# Altium footprint library Footprints.PcbLib: 118 footprints (part 5 of 8)
Each footprint in its own frame and in the unit in brackets; x right, y up, seen from the top. Pads: shape width x height; smd on the part's side, far side on the other; paste and mask are expansions set on the pad; w line width, h text height; cw(c..) or ccw(c..) is an arc to the next point about the centre after c.
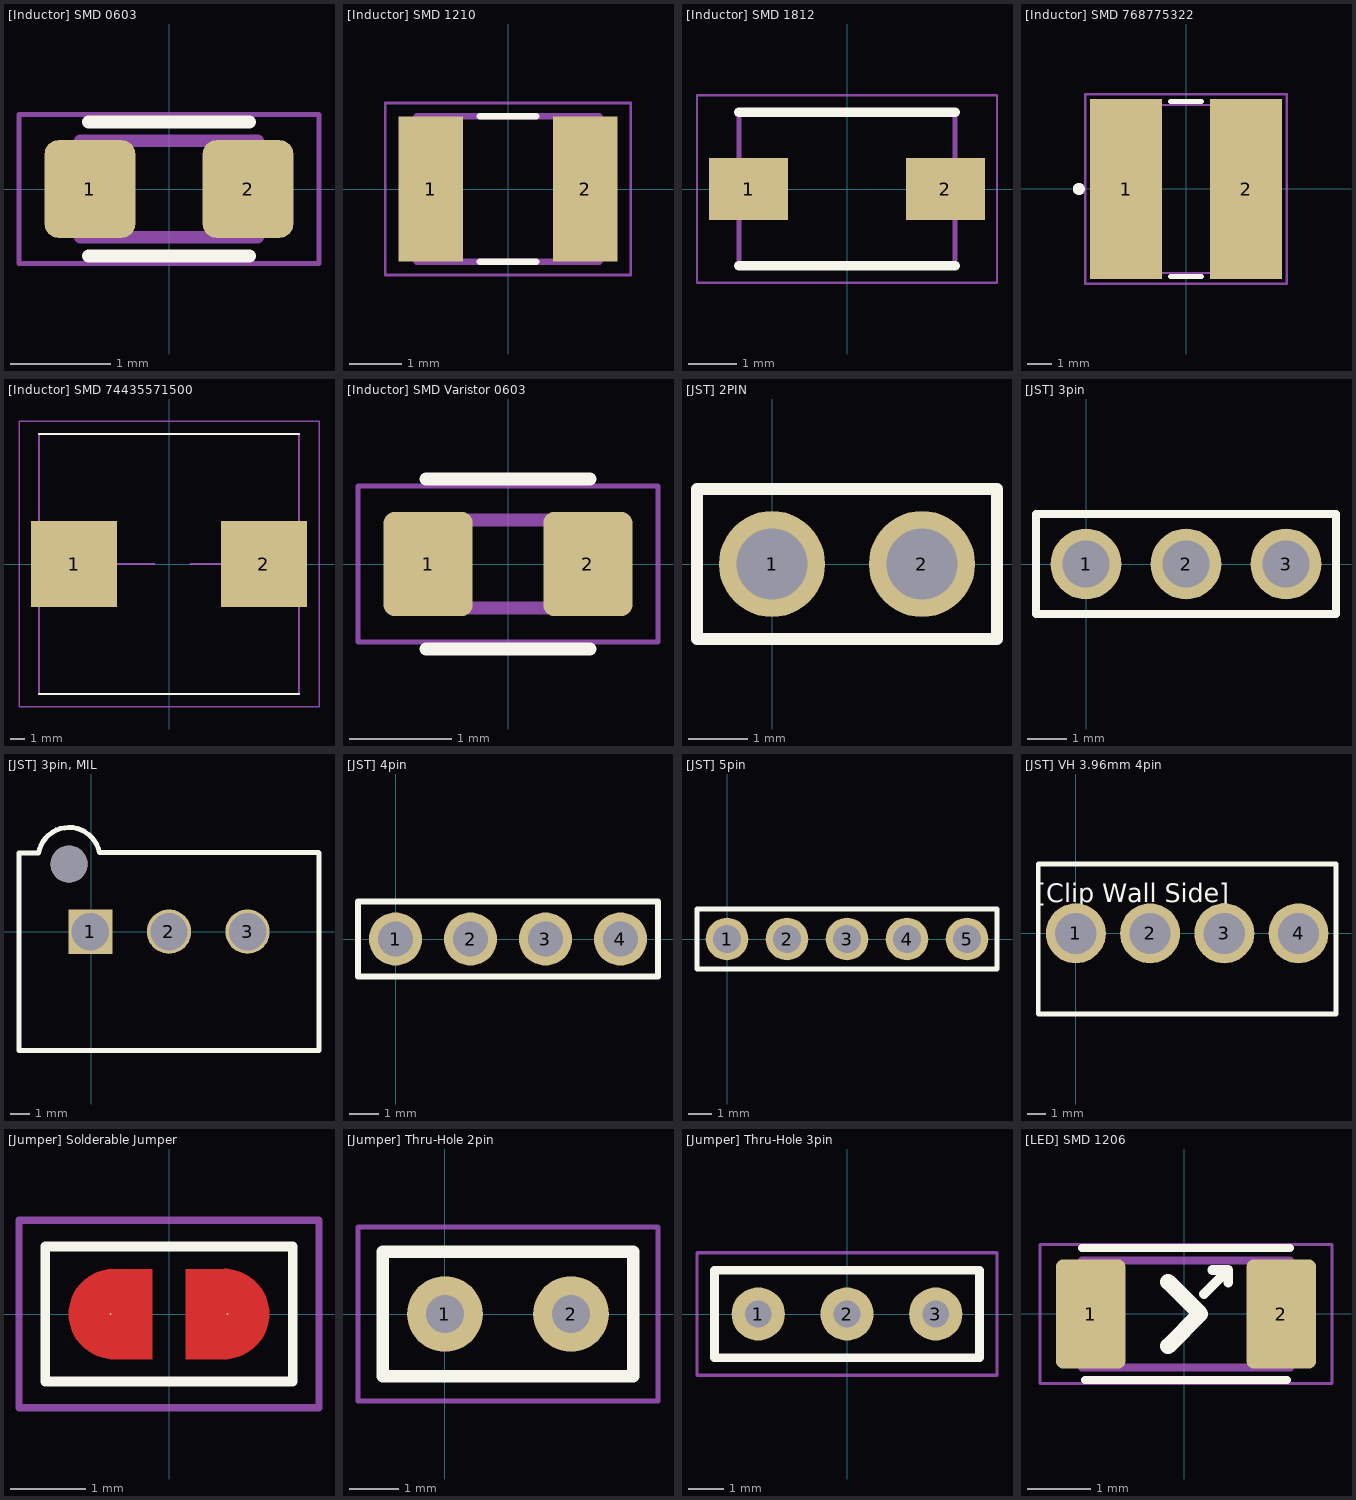
[diagram p4: the footprints below, top view; thin cyan lines are the x and y axes]

## [Inductor] SMD 0603 [mm]
pads (2):
  rrect30% 0.9x0.97 smd: 1(-0.785,0) 2(0.785,0)
Top Overlay:
  lines w0.127: -0.8,-0.665 0.8,-0.665 ; -0.8,0.665 0.8,0.665
Physical Outline:
  lines w0.127: -0.88,-0.48 0.88,-0.48 0.88,0.48 -0.88,0.48 -0.88,-0.48
Part Border:
  lines w0.05: -1.49,-0.74 -1.49,0.74 1.49,0.74 1.49,-0.74 -1.49,-0.74
3D body "SMD Inductor [0603].STEP": height 0.95, standoff 0, extent -0.8,-0.4 0.8,0.4

## [Inductor] SMD 1210 [mm]
pads (2):
  rect 1.23x2.76 smd: 1(-1.466,0) 2(1.466,0)
Top Overlay:
  lines w0.127: -0.53,-1.38 0.53,-1.38 ; -0.53,1.38 0.53,1.38
Physical Outline:
  lines w0.127: -1.73,-1.38 1.73,-1.38 1.73,1.38 -1.73,1.38 -1.73,-1.38
Part Border:
  lines w0.05: -2.331,-1.631 2.331,-1.631 2.331,1.631 -2.331,1.631 -2.331,-1.631
3D body "SMD Resistor [1210].STEP": height 0.6, standoff 0, extent -1.6,-1.25 1.6,1.25

## [Inductor] SMD 1812 [mm]
pads (2):
  rect 1.65x1.3 smd: 1(-2.05,0) 2(2.05,0)
Top Overlay:
  lines w0.2: -2.25,-1.6 2.25,-1.6 ; -2.25,1.6 2.25,1.6
Physical Outline:
  lines w0.1: -2.25,-1.6 2.25,-1.6 2.25,1.6 -2.25,1.6 -2.25,-1.6
Part Border:
  lines w0.05: -3.125,-1.952 3.125,-1.952 3.125,1.952 -3.125,1.952 -3.125,-1.952
3D body "ISC1812ER101J.stp": height 3.4, standoff 0, extent -2.25,-1.6 2.25,1.6

## [Inductor] SMD 768775322 [mm] "768775322"
pads (2):
  rect 3x7.5 smd: 1(-2.5,0) 2(2.5,0)
Top Overlay:
  circle w0.25: c-4.466,0 r0.125
  lines w0.2: -0.65,-3.65 0.65,-3.65 ; -0.65,3.65 0.65,3.65
Physical Outline:
  circle w0.1: c-3.2,0 r0.3
  lines w0.1: -1.744,-3.488 cw(c0,0) -1.719,3.5 1.719,3.5 ; -1.719,-3.5 1.719,-3.5 ; 1.719,3.5 cw(c0,0) 1.744,-3.488
Part Border:
  lines w0.1: -4.2,-3.95 -4.2,3.95 4.2,3.95 4.2,-3.95 -4.2,-3.95
3D body "IndPD2HV_7850.stp": height 4.9, standoff 0, extent -3.813,-3.5 3.813,3.5

## [Inductor] SMD 74435571500 [mm]
pads (2):
  rect 6x6 smd: 1(-6.65,0) 2(6.65,0)
Top Overlay:
  lines w0.127: -9.1,-9.1 9.1,-9.1 ; -9.1,9.1 9.1,9.1
Physical Outline:
  lines w0.127: -9.1,-9.1 -9.1,9.1 ; -6.5,0 -1,0 ; 1.5,0 6,0 ; 9.1,-9.1 9.1,9.1
Part Border:
  lines w0.1: -10.5,-10 10.5,-10 10.5,10 -10.5,10 -10.5,-10
3D body "74435571500.stp": height 8.9, standoff 0, extent -9.15,-9.1 9.15,9.1

## [Inductor] SMD Varistor 0603 [mm] "CG0603MLC-05E"
pads (2):
  rrect25% 0.87x1.02 smd: 1(-0.78,0) 2(0.78,0)
Top Overlay:
  lines w0.127: -0.8,-0.83 0.8,-0.83 ; -0.8,0.83 0.8,0.83
Physical Outline:
  lines w0.127: -0.8,-0.43 -0.8,0.43 0.8,0.43 0.8,-0.43 -0.8,-0.43
Part Border:
  lines w0.05: -1.465,-0.76 1.465,-0.76 1.465,0.76 -1.465,0.76 -1.465,-0.76
3D body "SMD Varistor [0603].STEP": height 0.53, standoff -0.03, extent -0.8,-0.4 0.8,0.4

## [JST] 2PIN [mm]
pads (2):
  round 1.8 hole 1.2: 1(0,0) 2(2.54,0)
Top Overlay:
  lines w0.2: -1.27,-1.27 3.81,-1.27 3.81,1.27 -1.27,1.27 -1.27,-1.27
3D body "JST 2_54 2x.STEP": height 7.88, standoff -2.2, extent -2.4,-2.275 4.94,3.475

## [JST] 3pin [mm]
pads (3):
  round 1.8 hole 1.2: 1(0,0) 2(2.54,0) 3(5.08,0)
Top Overlay:
  lines w0.2: -1.27,-1.27 -1.27,1.27 6.35,1.27 6.35,-1.27 -1.27,-1.27
3D body "JST 2_54 3x.STEP": height 7.88, standoff -2.2, extent -2.47,-2.325 7.41,3.425

## [JST] 3pin, MIL [mm]
pads (4):
  rect 2.24x2.24 hole 1.89: 1(-0.036,0.004)
  round 2.24 hole 1.89: 2(3.924,0.004) 3(7.884,0.004)
  round 1.86 hole 1.86 unplated: ""(-1.116,3.404)
Top Overlay:
  lines w0.254: -3.641,3.899 -3.641,3.254 -3.641,-5.996 11.489,-5.996 11.489,3.964 11.469,3.984 0.411,3.984 ccw(c-1.119,3.7) -2.653,3.956 -2.988,3.956 -3.641,3.956
3D body "c-1877285-3-c-3d.stp": height 12.01, standoff -3.61, extent -3.601,-5.881 11.529,4.004

## [JST] 4pin [mm]
pads (4):
  round 1.8 hole 1.2: 1(0,0) 2(2.54,0) 3(5.08,0) 4(7.62,0)
Top Overlay:
  lines w0.2: -1.27,-1.27 -1.27,1.27 8.89,1.27 8.89,-1.27 -1.27,-1.27
3D body "JST 2_54 4x.STEP": height 6.88, standoff -3.2, extent -2.46,-2.175 9.96,3.575

## [JST] 5pin [mm]
pads (5):
  round 1.8 hole 1.2: 1(0,0) 2(2.54,0) 3(5.08,0) 4(7.62,0) 5(10.16,0)
Top Overlay:
  lines w0.2: -1.27,-1.27 11.43,-1.27 11.43,1.27 -1.27,1.27 -1.27,-1.27
3D body "5pin JST female.step": height 7.14, standoff -3.45, extent -2.375,-2.405 12.535,3.5

## [JST] VH 3.96mm 4pin [mm]
pads (4):
  round 3.2 hole 2.2: 1(0,0) 2(3.96,0) 3(7.92,0) 4(11.88,0)
Top Overlay:
  lines w0.254: -2,-4.3 -2,3.7 13.88,3.7 13.88,-4.3 -2,-4.3
  text "[Clip Wall Side]" at -2.124,1.674 h1
3D body "JST VH 3.96mm 4pin.step": height 11.7, standoff -2.9, extent -2,-4.5 13.9,3.2

## [Jumper] Solderable Jumper [mil]
pads (2):
  round 1 smd: 1(-30.71,0) 2(30.71,0)
Top Layer:
  region: 8.9,-23.62 8.9,23.62 28.9,23.62 30.76,23.62 34.43,23.04 37.97,21.89 41.28,20.2 44.29,18.02 46.92,15.39 49.1,12.38 50.79,9.07 51.94,5.53 52.52,1.86 52.52,-1.86 51.94,-5.53 50.79,-9.07 49.1,-12.38 46.92,-15.39 44.29,-18.02 41.28,-20.2 37.97,-21.89 34.43,-23.04 30.76,-23.62 28.9,-23.62
  region: -8.9,-23.62 -8.9,23.62 -28.9,23.62 -30.76,23.62 -34.43,23.04 -37.97,21.89 -41.28,20.2 -44.29,18.02 -46.92,15.39 -49.1,12.38 -50.79,9.07 -51.94,5.53 -52.52,1.86 -52.52,-1.86 -51.94,-5.53 -50.79,-9.07 -49.1,-12.38 -46.92,-15.39 -44.29,-18.02 -41.28,-20.2 -37.97,-21.89 -34.43,-23.04 -30.76,-23.62 -28.9,-23.62
Top Overlay:
  lines w5: -64.96,-35.43 -64.96,35.43 64.96,35.43 64.96,-35.43 ; -63.39,-35.43 63.39,-35.43
Part Border:
  lines w3.94: -78.74,-49.21 78.74,-49.21 78.74,49.21 -78.74,49.21 -78.74,-49.21

## [Jumper] Thru-Hole 2pin [mil]
pads (2):
  round 60 hole 30: 1(0,0) 2(100,0)
Top Overlay:
  lines w10: -49.21,-49.21 -49.21,49.21 149.21,49.21 149.21,-49.21 -49.21,-49.21
Part Border:
  lines w3.94: -68.9,-68.9 168.9,-68.9 168.9,68.9 -68.9,68.9 -68.9,-68.9
3D body "Pin Header 1x2 TH Pitch 2.54mm.stp": height 373.85, standoff -125.98, extent -50,-50 150,50

## [Jumper] Thru-Hole 3pin [mil]
pads (3):
  round 60 hole 30: 1(-100,0) 2(0,0) 3(100,0)
Top Overlay:
  lines w10: -149.21,-49.21 -149.21,49.21 149.21,49.21 149.21,-49.21 -149.21,-49.21
Part Border:
  lines w3.94: -168.9,-68.9 168.9,-68.9 168.9,68.9 -168.9,68.9 -168.9,-68.9
3D body "Pin Header 1x3 TH Pitch 2.54mm.stp": height 373.85, standoff -125.98, extent -150,-50 150,50

## [LED] SMD 1206 [mm]
pads (2):
  rrect20% 1.1x1.73 smd: 1(-1.48,0) 2(1.54,0)
Top Overlay:
  lines w0.127: -1.62,1.045 1.68,1.045 ; -1.57,-1.045 1.63,-1.045
  lines w0.155: 0.318,0.318 0.699,0.699 ; 0.445,0.699 0.699,0.699 ; 0.699,0.499 0.699,0.699
  lines w0.254: -0.254,-0.508 0.254,0 -0.254,0.508
Physical Outline:
  lines w0.127: -1.62,-0.85 -1.62,0.85 1.68,0.85 1.68,-0.85 -1.62,-0.85
Part Border:
  lines w0.05: -2.28,-1.1 -2.28,1.1 2.34,1.1 2.34,-1.1 -2.28,-1.1
3D body "step_temp.STEP": height 1.07, standoff -0.03, extent -1.57,-0.8 1.63,0.8